# Altium footprint library Connector_PinHeader_2.54mm.PcbLib: 278 footprints (part 1 of 18)
Each footprint in its own frame and in the unit in brackets; x right, y up, seen from the top. Pads: shape width x height; smd on the part's side, far side on the other; paste and mask are expansions set on the pad; w line width, h text height; cw(c..) or ccw(c..) is an arc to the next point about the centre after c.
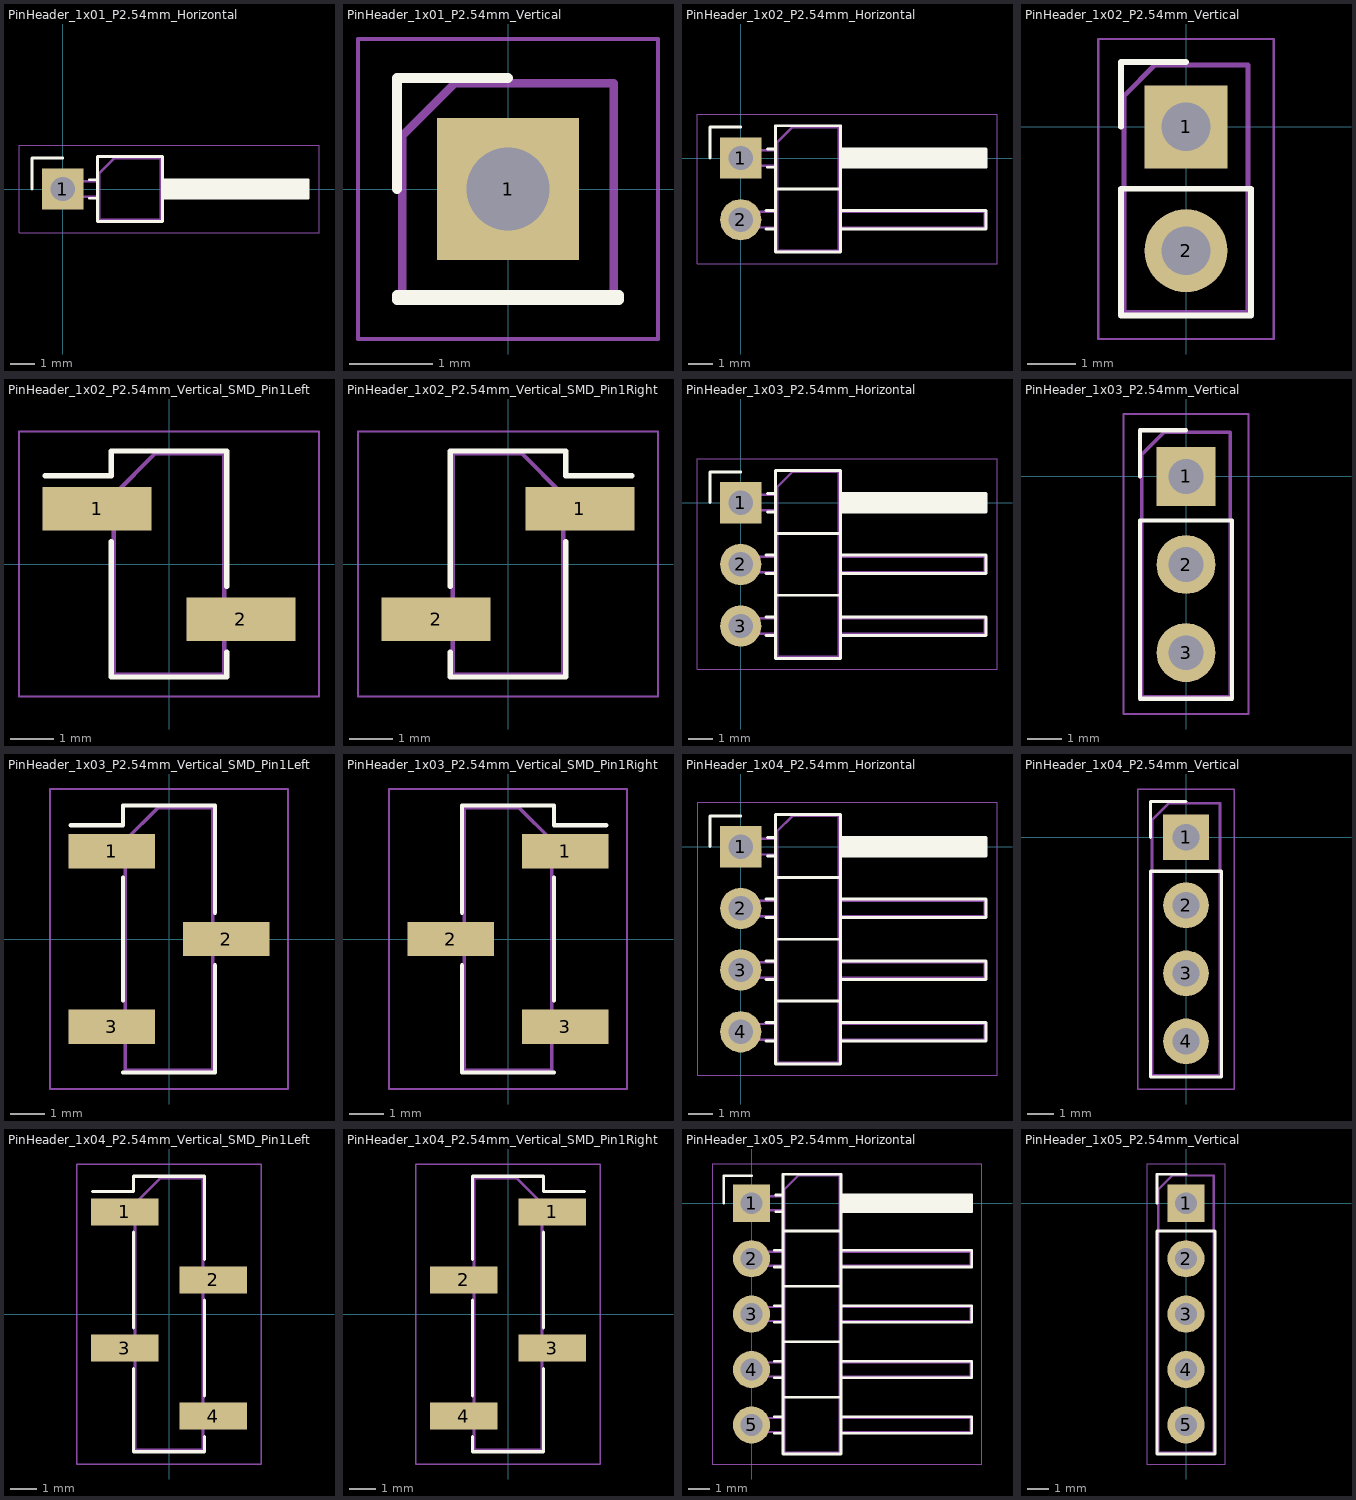
[diagram p0: the footprints below, top view; thin cyan lines are the x and y axes]

## PinHeader_1x01_P2.54mm_Horizontal [mm]
pads (1):
  rect 1.7x1.7 hole 1: 1(0,0)
F.SilkS:
  lines w0.12: -1.27,0 -1.27,1.27 0,1.27 ; 1.11,-0.38 1.44,-0.38 ; 1.11,0.38 1.44,0.38 ; 4.1,-0.38 10.1,-0.38 10.1,0.38 4.1,0.38 ; 4.1,-0.28 10.1,-0.28 ; 4.1,-0.16 10.1,-0.16 ; 4.1,-0.04 10.1,-0.04 ; 4.1,0.08 10.1,0.08 ; 4.1,0.2 10.1,0.2 ; 4.1,0.32 10.1,0.32 ; 1.44,-1.33 4.1,-1.33 4.1,1.33 1.44,1.33 1.44,-1.33
F.CrtYd:
  lines w0.05: -1.8,-1.8 -1.8,1.8 10.55,1.8 10.55,-1.8 -1.8,-1.8
F.Fab:
  lines w0.1: 1.5,-0.32 -0.32,-0.32 -0.32,0.32 1.5,0.32 ; 4.04,-0.32 10.04,-0.32 10.04,0.32 4.04,0.32 ; 1.5,-1.27 4.04,-1.27 4.04,1.27 2.135,1.27 1.5,0.635 1.5,-1.27
  text "'.Designator'" at 3.61,-4.047 h1
3D body "PinHeader_1x01_P2.54mm_Horizontal.step": height 2.54, standoff -3, extent -0.32,-1.27 10.04,1.27

## PinHeader_1x01_P2.54mm_Vertical [mm]
pads (1):
  rect 1.7x1.7 hole 1: 1(0,0)
F.SilkS:
  lines w0.12: -1.33,0 -1.33,1.33 0,1.33 ; -1.33,-1.33 -1.33,-1.27 1.33,-1.27 1.33,-1.33 -1.33,-1.33
F.CrtYd:
  lines w0.05: -1.8,-1.8 -1.8,1.8 1.8,1.8 1.8,-1.8 -1.8,-1.8
F.Fab:
  lines w0.1: -1.27,-1.27 1.27,-1.27 1.27,1.27 -0.635,1.27 -1.27,0.635 -1.27,-1.27
  text "'.Designator'" at 0.84,-4.047 h1
3D body "PinHeader_1x01_P2.54mm_Vertical.step": height 8.54, standoff -3, extent -1.27,-1.27 1.27,1.27

## PinHeader_1x02_P2.54mm_Horizontal [mm]
pads (2):
  rect 1.7x1.7 hole 1: 1(0,0)
  rrect100% 1.7x1.7 hole 1: 2(0,-2.54)
F.SilkS:
  lines w0.12: -1.27,0 -1.27,1.27 0,1.27 ; 1.043,-2.92 1.44,-2.92 ; 1.043,-2.16 1.44,-2.16 ; 1.11,-0.38 1.44,-0.38 ; 1.11,0.38 1.44,0.38 ; 1.44,-1.27 4.1,-1.27 ; 4.1,-2.92 10.1,-2.92 10.1,-2.16 4.1,-2.16 ; 4.1,-0.38 10.1,-0.38 10.1,0.38 4.1,0.38 ; 4.1,-0.28 10.1,-0.28 ; 4.1,-0.16 10.1,-0.16 ; 4.1,-0.04 10.1,-0.04 ; 4.1,0.08 10.1,0.08 ; 4.1,0.2 10.1,0.2 ; 4.1,0.32 10.1,0.32 ; 1.44,-3.87 1.44,1.33 4.1,1.33 4.1,-3.87 1.44,-3.87
F.CrtYd:
  lines w0.05: -1.8,-4.35 10.55,-4.35 10.55,1.8 -1.8,1.8 -1.8,-4.35
F.Fab:
  lines w0.1: 1.5,-2.86 -0.32,-2.86 -0.32,-2.22 1.5,-2.22 ; 1.5,-0.32 -0.32,-0.32 -0.32,0.32 1.5,0.32 ; 4.04,-2.86 10.04,-2.86 10.04,-2.22 4.04,-2.22 ; 4.04,-0.32 10.04,-0.32 10.04,0.32 4.04,0.32 ; 1.5,-3.81 1.5,0.635 2.135,1.27 4.04,1.27 4.04,-3.81 1.5,-3.81
  text "'.Designator'" at 3.61,-5.317 h1
3D body "PinHeader_1x02_P2.54mm_Horizontal.step": height 2.54, standoff -3, extent -0.32,-3.81 10.04,1.27

## PinHeader_1x02_P2.54mm_Vertical [mm]
pads (2):
  rect 1.7x1.7 hole 1: 1(0,0)
  rrect100% 1.7x1.7 hole 1: 2(0,-2.54)
F.SilkS:
  lines w0.12: -1.33,0 -1.33,1.33 0,1.33 ; -1.33,-3.87 1.33,-3.87 1.33,-1.27 -1.33,-1.27 -1.33,-3.87
F.CrtYd:
  lines w0.05: -1.8,-4.35 -1.8,1.8 1.8,1.8 1.8,-4.35 -1.8,-4.35
F.Fab:
  lines w0.1: -1.27,-3.81 1.27,-3.81 1.27,1.27 -0.635,1.27 -1.27,0.635 -1.27,-3.81
  text "'.Designator'" at 0.84,-5.317 h1
3D body "PinHeader_1x02_P2.54mm_Vertical.step": height 8.54, standoff -3, extent -1.27,-3.81 1.27,1.27

## PinHeader_1x02_P2.54mm_Vertical_SMD_Pin1Left [mm]
pads (2):
  rect 2.51x1 smd: 1(-1.655,1.27) 2(1.655,-1.27)
F.SilkS:
  lines w0.12: -2.85,2.03 -1.33,2.03 -1.33,2.6 1.33,2.6 1.33,-0.51 ; -1.33,0.51 -1.33,-2.6 1.33,-2.6 1.33,-2.03
F.CrtYd:
  lines w0.05: -3.45,-3.05 3.45,-3.05 3.45,3.05 -3.45,3.05 -3.45,-3.05
F.Fab:
  lines w0.1: -1.27,0.95 -2.54,0.95 -2.54,1.59 -1.27,1.59 ; 1.27,-1.59 2.54,-1.59 2.54,-0.95 1.27,-0.95 ; -1.27,1.59 -0.32,2.54 1.27,2.54 1.27,-2.54 -1.27,-2.54 -1.27,1.59
  text "'.Designator'" at 0.84,-4.047 h1
3D body "PinHeader_1x02_P2.54mm_Vertical_SMD_Pin1Left.step": height 9.3, standoff 0, extent -2.5,-2.54 2.5,2.54

## PinHeader_1x02_P2.54mm_Vertical_SMD_Pin1Right [mm]
pads (2):
  rect 2.51x1 smd: 1(1.655,1.27) 2(-1.655,-1.27)
F.SilkS:
  lines w0.12: -1.33,-2.03 -1.33,-2.6 1.33,-2.6 1.33,0.51 ; -1.33,-0.51 -1.33,2.6 1.33,2.6 1.33,2.03 2.85,2.03
F.CrtYd:
  lines w0.05: -3.45,-3.05 3.45,-3.05 3.45,3.05 -3.45,3.05 -3.45,-3.05
F.Fab:
  lines w0.1: -1.27,-1.59 -2.54,-1.59 -2.54,-0.95 -1.27,-0.95 ; 1.27,0.95 2.54,0.95 2.54,1.59 1.27,1.59 ; 1.27,1.59 0.32,2.54 -1.27,2.54 -1.27,-2.54 1.27,-2.54 1.27,1.59
  text "'.Designator'" at 0.84,-4.047 h1
3D body "PinHeader_1x02_P2.54mm_Vertical_SMD_Pin1Right.step": height 9.3, standoff 0, extent -2.5,-2.54 2.5,2.54

## PinHeader_1x03_P2.54mm_Horizontal [mm]
pads (3):
  rect 1.7x1.7 hole 1: 1(0,0)
  rrect100% 1.7x1.7 hole 1: 2(0,-2.54) 3(0,-5.08)
F.SilkS:
  lines w0.12: -1.27,0 -1.27,1.27 0,1.27 ; 1.043,-5.46 1.44,-5.46 ; 1.043,-4.7 1.44,-4.7 ; 1.043,-2.92 1.44,-2.92 ; 1.043,-2.16 1.44,-2.16 ; 1.11,-0.38 1.44,-0.38 ; 1.11,0.38 1.44,0.38 ; 1.44,-3.81 4.1,-3.81 ; 1.44,-1.27 4.1,-1.27 ; 4.1,-5.46 10.1,-5.46 10.1,-4.7 4.1,-4.7 ; 4.1,-2.92 10.1,-2.92 10.1,-2.16 4.1,-2.16 ; 4.1,-0.38 10.1,-0.38 10.1,0.38 4.1,0.38 ; 4.1,-0.28 10.1,-0.28 ; 4.1,-0.16 10.1,-0.16 ; 4.1,-0.04 10.1,-0.04 ; 4.1,0.08 10.1,0.08 ; 4.1,0.2 10.1,0.2 ; 4.1,0.32 10.1,0.32 ; 1.44,-6.41 4.1,-6.41 4.1,1.33 1.44,1.33 1.44,-6.41
F.CrtYd:
  lines w0.05: -1.8,-6.85 -1.8,1.8 10.55,1.8 10.55,-6.85 -1.8,-6.85
F.Fab:
  lines w0.1: 1.5,-5.4 -0.32,-5.4 -0.32,-4.76 1.5,-4.76 ; 1.5,-2.86 -0.32,-2.86 -0.32,-2.22 1.5,-2.22 ; 1.5,-0.32 -0.32,-0.32 -0.32,0.32 1.5,0.32 ; 4.04,-5.4 10.04,-5.4 10.04,-4.76 4.04,-4.76 ; 4.04,-2.86 10.04,-2.86 10.04,-2.22 4.04,-2.22 ; 4.04,-0.32 10.04,-0.32 10.04,0.32 4.04,0.32 ; 1.5,-6.35 1.5,0.635 2.135,1.27 4.04,1.27 4.04,-6.35 1.5,-6.35
  text "'.Designator'" at 3.61,-6.587 h1
3D body "PinHeader_1x03_P2.54mm_Horizontal.step": height 2.54, standoff -3, extent -0.32,-6.35 10.04,1.27

## PinHeader_1x03_P2.54mm_Vertical [mm]
pads (3):
  rect 1.7x1.7 hole 1: 1(0,0)
  rrect100% 1.7x1.7 hole 1: 2(0,-2.54) 3(0,-5.08)
F.SilkS:
  lines w0.12: -1.33,0 -1.33,1.33 0,1.33 ; -1.33,-6.41 1.33,-6.41 1.33,-1.27 -1.33,-1.27 -1.33,-6.41
F.CrtYd:
  lines w0.05: -1.8,-6.85 1.8,-6.85 1.8,1.8 -1.8,1.8 -1.8,-6.85
F.Fab:
  lines w0.1: -1.27,-6.35 1.27,-6.35 1.27,1.27 -0.635,1.27 -1.27,0.635 -1.27,-6.35
  text "'.Designator'" at 0.357,-6.437 h1
3D body "PinHeader_1x03_P2.54mm_Vertical.step": height 8.54, standoff -3, extent -1.27,-6.35 1.27,1.27

## PinHeader_1x03_P2.54mm_Vertical_SMD_Pin1Left [mm]
pads (3):
  rect 2.51x1 smd: 1(-1.655,2.54) 2(1.655,0) 3(-1.655,-2.54)
F.SilkS:
  lines w0.12: -2.85,3.3 -1.33,3.3 -1.33,3.87 1.33,3.87 1.33,0.76 ; -1.33,-3.87 1.33,-3.87 ; -1.33,-1.78 -1.33,1.78 ; 1.33,-3.3 1.33,-3.87 ; 1.33,-0.76 1.33,-3.87
F.CrtYd:
  lines w0.05: -3.45,-4.35 -3.45,4.35 3.45,4.35 3.45,-4.35 -3.45,-4.35
F.Fab:
  lines w0.1: -1.27,-2.86 -2.54,-2.86 -2.54,-2.22 -1.27,-2.22 ; -1.27,2.22 -2.54,2.22 -2.54,2.86 -1.27,2.86 ; 1.27,-0.32 2.54,-0.32 2.54,0.32 1.27,0.32 ; -1.27,2.86 -1.27,-3.81 1.27,-3.81 1.27,3.81 -0.32,3.81 -1.27,2.86
  text "'.Designator'" at 0.84,-4.047 h1
3D body "PinHeader_1x03_P2.54mm_Vertical_SMD_Pin1Left.step": height 9.3, standoff 0, extent -2.5,-3.81 2.5,3.81

## PinHeader_1x03_P2.54mm_Vertical_SMD_Pin1Right [mm]
pads (3):
  rect 2.51x1 smd: 1(1.655,2.54) 2(-1.655,0) 3(1.655,-2.54)
F.SilkS:
  lines w0.12: -1.33,-3.3 -1.33,-3.87 ; -1.33,-0.76 -1.33,-3.87 ; -1.33,0.76 -1.33,3.87 1.33,3.87 1.33,3.3 2.85,3.3 ; 1.33,-3.87 -1.33,-3.87 ; 1.33,-1.78 1.33,1.78
F.CrtYd:
  lines w0.05: -3.45,-4.35 3.45,-4.35 3.45,4.35 -3.45,4.35 -3.45,-4.35
F.Fab:
  lines w0.1: -1.27,-0.32 -2.54,-0.32 -2.54,0.32 -1.27,0.32 ; 1.27,-2.86 2.54,-2.86 2.54,-2.22 1.27,-2.22 ; 1.27,2.22 2.54,2.22 2.54,2.86 1.27,2.86 ; 1.27,2.86 1.27,-3.81 -1.27,-3.81 -1.27,3.81 0.32,3.81 1.27,2.86
  text "'.Designator'" at 0.84,-4.047 h1
3D body "PinHeader_1x03_P2.54mm_Vertical_SMD_Pin1Right.step": height 9.3, standoff 0, extent -2.5,-3.81 2.5,3.81

## PinHeader_1x04_P2.54mm_Horizontal [mm]
pads (4):
  rect 1.7x1.7 hole 1: 1(0,0)
  rrect100% 1.7x1.7 hole 1: 2(0,-2.54) 3(0,-5.08) 4(0,-7.62)
F.SilkS:
  lines w0.12: -1.27,0 -1.27,1.27 0,1.27 ; 1.043,-8 1.44,-8 ; 1.043,-7.24 1.44,-7.24 ; 1.043,-5.46 1.44,-5.46 ; 1.043,-4.7 1.44,-4.7 ; 1.043,-2.92 1.44,-2.92 ; 1.043,-2.16 1.44,-2.16 ; 1.11,-0.38 1.44,-0.38 ; 1.11,0.38 1.44,0.38 ; 1.44,-6.35 4.1,-6.35 ; 1.44,-3.81 4.1,-3.81 ; 1.44,-1.27 4.1,-1.27 ; 4.1,-8 10.1,-8 10.1,-7.24 4.1,-7.24 ; 4.1,-5.46 10.1,-5.46 10.1,-4.7 4.1,-4.7 ; 4.1,-2.92 10.1,-2.92 10.1,-2.16 4.1,-2.16 ; 4.1,-0.38 10.1,-0.38 10.1,0.38 4.1,0.38 ; 4.1,-0.28 10.1,-0.28 ; 4.1,-0.16 10.1,-0.16 ; 4.1,-0.04 10.1,-0.04 ; 4.1,0.08 10.1,0.08 ; 4.1,0.2 10.1,0.2 ; 4.1,0.32 10.1,0.32 ; 1.44,-8.95 1.44,1.33 4.1,1.33 4.1,-8.95 1.44,-8.95
F.CrtYd:
  lines w0.05: -1.8,-9.4 -1.8,1.8 10.55,1.8 10.55,-9.4 -1.8,-9.4
F.Fab:
  lines w0.1: 1.5,-7.94 -0.32,-7.94 -0.32,-7.3 1.5,-7.3 ; 1.5,-5.4 -0.32,-5.4 -0.32,-4.76 1.5,-4.76 ; 1.5,-2.86 -0.32,-2.86 -0.32,-2.22 1.5,-2.22 ; 1.5,-0.32 -0.32,-0.32 -0.32,0.32 1.5,0.32 ; 4.04,-7.94 10.04,-7.94 10.04,-7.3 4.04,-7.3 ; 4.04,-5.4 10.04,-5.4 10.04,-4.76 4.04,-4.76 ; 4.04,-2.86 10.04,-2.86 10.04,-2.22 4.04,-2.22 ; 4.04,-0.32 10.04,-0.32 10.04,0.32 4.04,0.32 ; 1.5,-8.89 1.5,0.635 2.135,1.27 4.04,1.27 4.04,-8.89 1.5,-8.89
  text "'.Designator'" at 3.61,-7.857 h1

## PinHeader_1x04_P2.54mm_Vertical [mm]
pads (4):
  rect 1.7x1.7 hole 1: 1(0,0)
  rrect100% 1.7x1.7 hole 1: 2(0,-2.54) 3(0,-5.08) 4(0,-7.62)
F.SilkS:
  lines w0.12: -1.33,0 -1.33,1.33 0,1.33 ; -1.33,-8.95 1.33,-8.95 1.33,-1.27 -1.33,-1.27 -1.33,-8.95
F.CrtYd:
  lines w0.05: -1.8,-9.4 1.8,-9.4 1.8,1.8 -1.8,1.8 -1.8,-9.4
F.Fab:
  lines w0.1: -1.27,-8.89 1.27,-8.89 1.27,1.27 -0.635,1.27 -1.27,0.635 -1.27,-8.89
  text "'.Designator'" at 0.84,-7.857 h1

## PinHeader_1x04_P2.54mm_Vertical_SMD_Pin1Left [mm]
pads (4):
  rect 2.51x1 smd: 1(-1.655,3.81) 2(1.655,1.27) 3(-1.655,-1.27) 4(1.655,-3.81)
F.SilkS:
  lines w0.12: -2.85,4.57 -1.33,4.57 -1.33,5.14 1.33,5.14 1.33,2.03 ; -1.33,-2.03 -1.33,-5.14 1.33,-5.14 1.33,-4.57 ; -1.33,-0.51 -1.33,3.05 ; 1.33,-3.05 1.33,0.51
F.CrtYd:
  lines w0.05: -3.45,-5.6 -3.45,5.6 3.45,5.6 3.45,-5.6 -3.45,-5.6
F.Fab:
  lines w0.1: -1.27,-1.59 -2.54,-1.59 -2.54,-0.95 -1.27,-0.95 ; -1.27,3.49 -2.54,3.49 -2.54,4.13 -1.27,4.13 ; 1.27,-4.13 2.54,-4.13 2.54,-3.49 1.27,-3.49 ; 1.27,0.95 2.54,0.95 2.54,1.59 1.27,1.59 ; -1.27,4.13 -0.32,5.08 1.27,5.08 1.27,-5.08 -1.27,-5.08 -1.27,4.13
  text "'.Designator'" at 0.84,-4.047 h1

## PinHeader_1x04_P2.54mm_Vertical_SMD_Pin1Right [mm]
pads (4):
  rect 2.51x1 smd: 1(1.655,3.81) 2(-1.655,1.27) 3(1.655,-1.27) 4(-1.655,-3.81)
F.SilkS:
  lines w0.12: -1.33,-4.57 -1.33,-5.14 1.33,-5.14 1.33,-2.03 ; -1.33,-3.05 -1.33,0.51 ; -1.33,2.03 -1.33,5.14 1.33,5.14 1.33,4.57 2.85,4.57 ; 1.33,-0.51 1.33,3.05
F.CrtYd:
  lines w0.05: -3.45,-5.6 -3.45,5.6 3.45,5.6 3.45,-5.6 -3.45,-5.6
F.Fab:
  lines w0.1: -1.27,-4.13 -2.54,-4.13 -2.54,-3.49 -1.27,-3.49 ; -1.27,0.95 -2.54,0.95 -2.54,1.59 -1.27,1.59 ; 1.27,-1.59 2.54,-1.59 2.54,-0.95 1.27,-0.95 ; 1.27,3.49 2.54,3.49 2.54,4.13 1.27,4.13 ; 1.27,4.13 1.27,-5.08 -1.27,-5.08 -1.27,5.08 0.32,5.08 1.27,4.13
  text "'.Designator'" at 0.84,-4.047 h1

## PinHeader_1x05_P2.54mm_Horizontal [mm]
pads (5):
  rect 1.7x1.7 hole 1: 1(0,0)
  rrect100% 1.7x1.7 hole 1: 2(0,-2.54) 3(0,-5.08) 4(0,-7.62) 5(0,-10.16)
F.SilkS:
  lines w0.12: -1.27,0 -1.27,1.27 0,1.27 ; 1.043,-10.54 1.44,-10.54 ; 1.043,-9.78 1.44,-9.78 ; 1.043,-8 1.44,-8 ; 1.043,-7.24 1.44,-7.24 ; 1.043,-5.46 1.44,-5.46 ; 1.043,-4.7 1.44,-4.7 ; 1.043,-2.92 1.44,-2.92 ; 1.043,-2.16 1.44,-2.16 ; 1.11,-0.38 1.44,-0.38 ; 1.11,0.38 1.44,0.38 ; 1.44,-8.89 4.1,-8.89 ; 1.44,-6.35 4.1,-6.35 ; 1.44,-3.81 4.1,-3.81 ; 1.44,-1.27 4.1,-1.27 ; 4.1,-10.54 10.1,-10.54 10.1,-9.78 4.1,-9.78 ; 4.1,-8 10.1,-8 10.1,-7.24 4.1,-7.24 ; 4.1,-5.46 10.1,-5.46 10.1,-4.7 4.1,-4.7 ; 4.1,-2.92 10.1,-2.92 10.1,-2.16 4.1,-2.16 ; 4.1,-0.38 10.1,-0.38 10.1,0.38 4.1,0.38 ; 4.1,-0.28 10.1,-0.28 ; 4.1,-0.16 10.1,-0.16 ; 4.1,-0.04 10.1,-0.04 ; 4.1,0.08 10.1,0.08 ; 4.1,0.2 10.1,0.2 ; 4.1,0.32 10.1,0.32 ; 1.44,-11.49 1.44,1.33 4.1,1.33 4.1,-11.49 1.44,-11.49
F.CrtYd:
  lines w0.05: -1.8,-11.95 -1.8,1.8 10.55,1.8 10.55,-11.95 -1.8,-11.95
F.Fab:
  lines w0.1: 1.5,-10.48 -0.32,-10.48 -0.32,-9.84 1.5,-9.84 ; 1.5,-7.94 -0.32,-7.94 -0.32,-7.3 1.5,-7.3 ; 1.5,-5.4 -0.32,-5.4 -0.32,-4.76 1.5,-4.76 ; 1.5,-2.86 -0.32,-2.86 -0.32,-2.22 1.5,-2.22 ; 1.5,-0.32 -0.32,-0.32 -0.32,0.32 1.5,0.32 ; 4.04,-10.48 10.04,-10.48 10.04,-9.84 4.04,-9.84 ; 4.04,-7.94 10.04,-7.94 10.04,-7.3 4.04,-7.3 ; 4.04,-5.4 10.04,-5.4 10.04,-4.76 4.04,-4.76 ; 4.04,-2.86 10.04,-2.86 10.04,-2.22 4.04,-2.22 ; 4.04,-0.32 10.04,-0.32 10.04,0.32 4.04,0.32 ; 1.5,-11.43 4.04,-11.43 4.04,1.27 2.135,1.27 1.5,0.635 1.5,-11.43
  text "'.Designator'" at 3.61,-9.127 h1

## PinHeader_1x05_P2.54mm_Vertical [mm]
pads (5):
  rect 1.7x1.7 hole 1: 1(0,0)
  rrect100% 1.7x1.7 hole 1: 2(0,-2.54) 3(0,-5.08) 4(0,-7.62) 5(0,-10.16)
F.SilkS:
  lines w0.12: -1.33,0 -1.33,1.33 0,1.33 ; -1.33,-11.49 -1.33,-1.27 1.33,-1.27 1.33,-11.49 -1.33,-11.49
F.CrtYd:
  lines w0.05: -1.8,-11.95 -1.8,1.8 1.8,1.8 1.8,-11.95 -1.8,-11.95
F.Fab:
  lines w0.1: -1.27,-11.43 -1.27,0.635 -0.635,1.27 1.27,1.27 1.27,-11.43 -1.27,-11.43
  text "'.Designator'" at 0.84,-9.127 h1